# Altium footprint library mastermind.PCBLIB: 1061 footprints (part 56 of 67)
Each footprint in its own frame and in the unit in brackets; x right, y up, seen from the top. Pads: shape width x height; smd on the part's side, far side on the other; paste and mask are expansions set on the pad; w line width, h text height; cw(c..) or ccw(c..) is an arc to the next point about the centre after c.
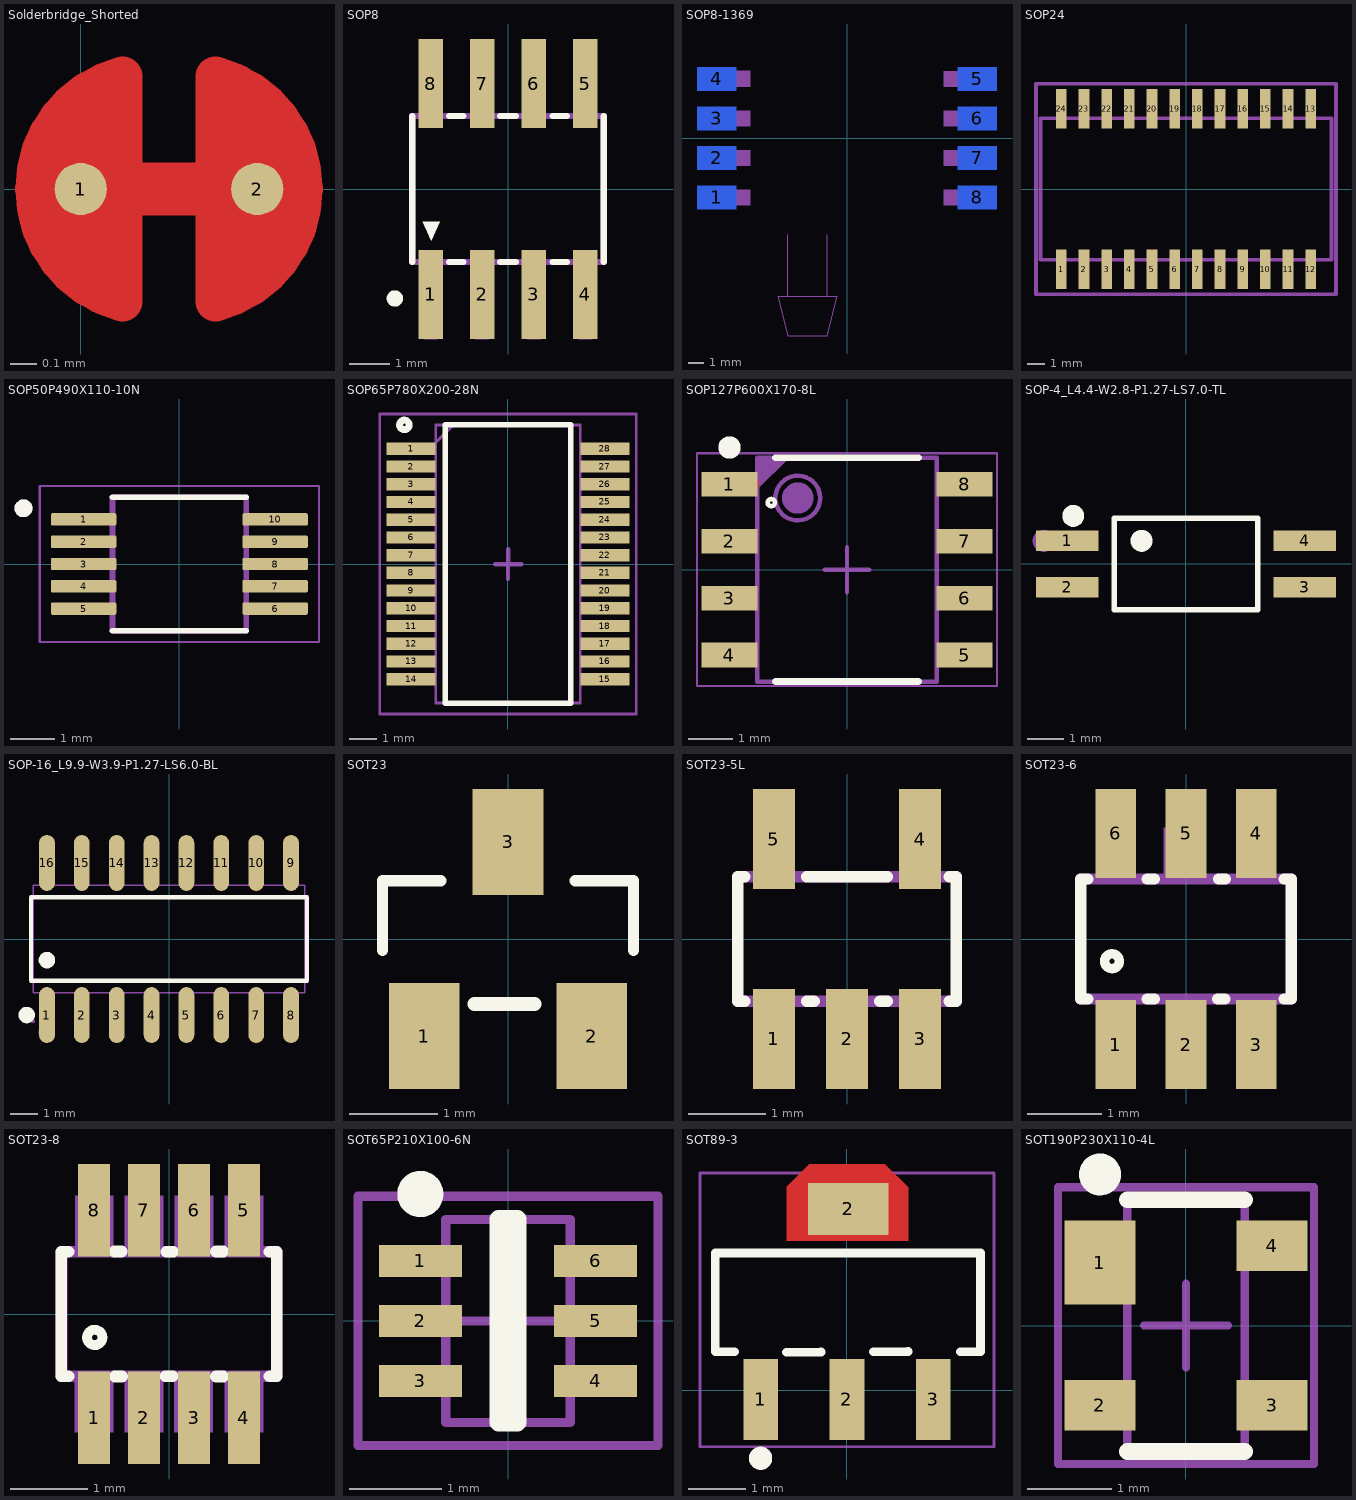
[diagram p55: the footprints below, top view; thin cyan lines are the x and y axes]

## Solderbridge_Shorted [mm]
pads (2):
  round 0.2 smd paste-10: 1(0,0) 2(0.676,0)
Top Layer:
  region: 0.236,-0.432 0.16,-0.505 0.042,-0.467 -0.023,-0.424 -0.097,-0.351 -0.15,-0.292 -0.208,-0.193 -0.236,-0.099 -0.231,0.122 -0.206,0.193 -0.122,0.33 -0.038,0.411 0.054,0.469 0.155,0.5 0.206,0.483 0.236,0.43
  region: 0.44,0.432 0.516,0.505 0.634,0.467 0.699,0.424 0.772,0.351 0.826,0.292 0.884,0.193 0.912,0.099 0.907,-0.122 0.881,-0.193 0.798,-0.33 0.714,-0.411 0.622,-0.469 0.521,-0.5 0.47,-0.483 0.44,-0.43
  lines w0.152: 0.159,-0.431 cw(c0.27,0) 0.159,0.431 ; 0.516,-0.431 ccw(c0.406,0) 0.516,0.431
  lines w0.203: 0,0 0.676,0
Top Solder:
  circle w0.61: c0.366,0 r0.279
  circle w0.61: c0.31,0 r0.279

## SOP8 [mm]
pads (8):
  rect 0.61x2.2 smd: 1(-1.905,-2.6) 2(-0.635,-2.6) 3(0.635,-2.6) 4(1.905,-2.6) 5(1.905,2.6) 6(0.635,2.6) 7(-0.635,2.6) 8(-1.905,2.6)
Top Overlay:
  circle w0.203: c-2.79,-2.7 r0.1
  region: -2.101,-0.802 -1.678,-0.802 -1.899,-1.278
  lines w0.152: -2.362,-1.803 -2.362,-0.497 -2.362,1.803 ; -1.45,-1.8 -1.1,-1.8 ; -1.45,1.8 -1.1,1.8 ; -0.2,-1.8 0.2,-1.8 ; -0.2,1.8 0.2,1.8 ; 1.1,-1.8 1.45,-1.8 ; 1.1,1.8 1.45,1.8 ; 2.362,-1.803 2.362,1.803
Mechanical 3:
  region: 1.727,1.854 1.727,3.7 2.083,3.7 2.083,1.854
  region: 0.457,1.854 0.457,3.7 0.813,3.7 0.813,1.854
  region: -0.813,1.854 -0.813,3.7 -0.457,3.7 -0.457,1.854
  region: -2.083,1.854 -2.083,3.7 -1.727,3.7 -1.727,1.854
  region: 1.727,-3.7 1.727,-1.854 2.083,-1.854 2.083,-3.7
  region: 0.457,-3.7 0.457,-1.854 0.813,-1.854 0.813,-3.7
  region: -0.813,-3.7 -0.813,-1.854 -0.457,-1.854 -0.457,-3.7
  region: -2.083,-3.7 -2.083,-1.854 -1.727,-1.854 -1.727,-3.7
  lines w0.152: -2.362,-1.803 -2.362,1.803 2.362,1.803 2.362,-1.803 -2.362,-1.803
3D body "User Library-sop8_model.STEP": height 1.55, standoff -0.01, extent -2.489,-2.966 2.411,3.013

## SOP8-1369 [mil]
pads (8):
  rect 100x60 smd far side: 1(-330,-150) 2(-330,-50) 3(-330,50) 4(-330,150) 5(330,150) 6(330,50) 7(330,-50) 8(330,-150)
Bottom Overlay:
  circle w0: c-187.5,-150 r23.58
  lines w8: -242.5,-230 ccw(c-230,-230) -230,-242.5 230,-242.5 ccw(c230,-230) 242.5,-230 ; -242.5,230 cw(c-230,230) -230,242.5 230,242.5 cw(c230,230) 242.5,230
Mechanical 13:
  region: -245,-130.16 -350.44,-130.16 -350.44,-170 -245,-170
  region: 350,-130.24 245.45,-130.24 245.45,-170 350,-170
  region: -245,-30.06 -350.66,-30.06 -350.66,-70 -245,-70
  region: -245,70.06 -350.3,70.06 -350.3,30 -245,30
  region: -245,170.23 -350.48,170.23 -350.48,130 -245,130
  region: 350,-30.06 245.48,-30.06 245.48,-70 350,-70
  region: 350,70.09 245.3,70.09 245.3,30 350,30
  region: 350,170.18 245.26,170.18 245.26,130 350,130
  lines w2: -150,-245 -150,-400 ; -50,-245 -50,-400 ; -150,-400 -175,-400 -150,-500 -50,-500 -25,-400 -50,-400 ; -150,-400 -50,-400
3D body "MPXV4006GP.STEP": height 340.06, standoff 0.5, extent -358.5,-492.5 358.5,232.5

## SOP24 [mm]
pads (24):
  rect 0.6x2.2 smd: 1(-6.985,-4.5) 2(-5.715,-4.5) 3(-4.445,-4.5) 4(-3.175,-4.5) 5(-1.905,-4.5) 6(-0.635,-4.5) 7(0.635,-4.5) 8(1.905,-4.5) 9(3.175,-4.5) 10(4.445,-4.5) 11(5.715,-4.5) 12(6.985,-4.5) 13(6.985,4.5) 14(5.715,4.5) 15(4.445,4.5) 16(3.175,4.5) 17(1.905,4.5) 18(0.635,4.5) 19(-0.635,4.5) 20(-1.905,4.5) 21(-3.175,4.5) 22(-4.445,4.5) 23(-5.715,4.5) 24(-6.985,4.5)
Mechanical 8:
  region: -7.235,-5.39 -7.235,-4.06 -6.735,-4.06 -6.735,-5.39
  region: -5.965,-5.39 -5.965,-4.06 -5.465,-4.06 -5.465,-5.39
  region: -4.695,-5.39 -4.695,-4.06 -4.195,-4.06 -4.195,-5.39
  region: -3.425,-5.39 -3.425,-4.06 -2.925,-4.06 -2.925,-5.39
  region: -2.155,-5.39 -2.155,-4.06 -1.655,-4.06 -1.655,-5.39
  region: -0.885,-5.39 -0.885,-4.06 -0.385,-4.06 -0.385,-5.39
  region: 0.385,-5.39 0.385,-4.06 0.885,-4.06 0.885,-5.39
  region: 1.655,-5.39 1.655,-4.06 2.155,-4.06 2.155,-5.39
  region: 2.925,-5.39 2.925,-4.06 3.425,-4.06 3.425,-5.39
  region: 4.195,-5.39 4.195,-4.06 4.695,-4.06 4.695,-5.39
  region: 5.465,-5.39 5.465,-4.06 5.965,-4.06 5.965,-5.39
  region: 6.735,-5.39 6.735,-4.06 7.235,-4.06 7.235,-5.39
  region: 6.735,4.06 6.735,5.39 7.235,5.39 7.235,4.06
  region: 5.465,4.06 5.465,5.39 5.965,5.39 5.965,4.06
  region: 4.195,4.06 4.195,5.39 4.695,5.39 4.695,4.06
  region: 2.925,4.06 2.925,5.39 3.425,5.39 3.425,4.06
  region: 1.655,4.06 1.655,5.39 2.155,5.39 2.155,4.06
  region: 0.385,4.06 0.385,5.39 0.885,5.39 0.885,4.06
  region: -0.885,4.06 -0.885,5.39 -0.385,5.39 -0.385,4.06
  region: -2.155,4.06 -2.155,5.39 -1.655,5.39 -1.655,4.06
  region: -3.425,4.06 -3.425,5.39 -2.925,5.39 -2.925,4.06
  region: -4.695,4.06 -4.695,5.39 -4.195,5.39 -4.195,4.06
  region: -5.965,4.06 -5.965,5.39 -5.465,5.39 -5.465,4.06
  region: -7.235,4.06 -7.235,5.39 -6.735,5.39 -6.735,4.06
  lines w0.203: -8.145,-3.96 8.145,-3.96 8.145,3.96 -8.145,3.96 -8.145,-3.96
Mechanical 29 (Mech34):
  lines w0.2: -8.4,-5.9 -8.4,5.9 8.4,5.9 8.4,-5.9 -8.4,-5.9

## SOP50P490X110-10N [mm]
pads (10):
  rrect25% 1.47x0.28 smd: 1(-2.15,1) 2(-2.15,0.5) 3(-2.15,0) 4(-2.15,-0.5) 5(-2.15,-1) 6(2.15,-1) 7(2.15,-0.5) 8(2.15,0) 9(2.15,0.5) 10(2.15,1)
Top Overlay:
  circle w0.2: c-3.5,1.25 r0.1
  lines w0.127: -1.5,-1.5 1.5,-1.5 ; -1.5,1.5 1.5,1.5
Mechanical 13:
  circle w0.2: c-3.5,1.25 r0.1
  lines w0.127: -1.5,-1.5 -1.5,1.5 1.5,1.5 1.5,-1.5 -1.5,-1.5
Mechanical 15:
  lines w0.05: -3.135,-1.75 -3.135,1.75 3.135,1.75 3.135,-1.75 -3.135,-1.75
3D body "ADS1115IDGST.STEP": height 0.96, standoff -0.14, extent -2.45,-1.5 2.45,1.5

## SOP65P780X200-28N [mm]
pads (28):
  rect 1.8x0.45 smd: 1(-3.55,4.225) 2(-3.55,3.575) 3(-3.55,2.925) 4(-3.55,2.275) 5(-3.55,1.625) 6(-3.55,0.975) 7(-3.55,0.325) 8(-3.55,-0.325) 9(-3.55,-0.975) 10(-3.55,-1.625) 11(-3.55,-2.275) 12(-3.55,-2.925) 13(-3.55,-3.575) 14(-3.55,-4.225) 15(3.55,-4.225) 16(3.55,-3.575) 17(3.55,-2.925) 18(3.55,-2.275) 19(3.55,-1.625) 20(3.55,-0.975) 21(3.55,-0.325) 22(3.55,0.325) 23(3.55,0.975) 24(3.55,1.625) 25(3.55,2.275) 26(3.55,2.925) 27(3.55,3.575) 28(3.55,4.225)
Top Overlay:
  circle w0.254: c-3.8,5.1 r0.175
  lines w0.2: -2.3,-5.1 -2.3,5.1 2.3,5.1 2.3,-5.1 -2.3,-5.1
Mechanical 13:
  lines w0.1: -2.65,4.45 -2,5.1 ; -2.65,-5.1 -2.65,5.1 2.65,5.1 2.65,-5.1 -2.65,-5.1
  lines w0.152: -0.47,-0.01 0.49,-0.01 ; 0,-0.55 0,0.53 0.01,0.54 0.01,-0.01
Mechanical 15:
  lines w0.1: -4.7,-5.5 -4.7,5.5 4.7,5.5 4.7,-5.5 -4.7,-5.5
3D body "GL850G-HH.stp": height -0.5, standoff -2.5, extent -3.77,-5.07 4.03,5.13

## SOP127P600X170-8L [mm] "SOP, 8-Leads, Body 4,90x3,90mm, Pitch 1,27mm, IPC High Density"
height 1.7
pads (8):
  rect 1.25x0.55 smd: 1(-2.625,1.905) 2(-2.625,0.635) 3(-2.625,-0.635) 4(-2.625,-1.905) 5(2.625,-1.905) 6(2.625,-0.635) 7(2.625,0.635) 8(2.625,1.905)
Top Layer:
  lines w0.3: -2.625,-1.905 -2.233,-1.905 ; -2.625,1.905 -2.111,1.905
Top Overlay:
  circle w0.25: c-2.625,2.73 r0.125
  circle w0.1: c-1.692,1.5 r0.08
  lines w0.152: -1.6,-2.5 1.6,-2.5 ; -1.6,2.5 1.6,2.5
Mechanical 13:
  circle w0.1: c-1.1,1.6 r0.5
  lines w0.1: -2,-2.5 -2,2.5 2,2.5 2,-2.5 -2,-2.5
Mechanical 15:
  lines w0.05: -3.35,-2.6 -3.35,2.6 3.35,2.6 3.35,-2.6 -3.35,-2.6
  lines w0.1: -0.5,0 0.5,0 ; 0,-0.5 0,0.5
Mechanical 29:
  circle w0.5: c-1.1,1.6 r0.1
  region: -1.294,2.5 -2,1.794 -2,2.5
  lines w0.1: -2,-2.5 2,-2.5 2,2.5 -2,2.5 -2,-2.5
  text ".Designator" at -0.677,0.508 h1.27
3D body: height 1, standoff 0, extent -1.078,1.106 -0.801,1.381
3D body "SOP127P600X170-8L.step": height 1.7, standoff 0, extent -3,-2.5 3,2.5

## SOP-4_L4.4-W2.8-P1.27-LS7.0-TL [mm]
pads (4):
  rect 1.71x0.56 smd paste+0 mask+0.051: 1(-3.255,0.635) 2(-3.255,-0.635) 3(3.255,-0.635) 4(3.255,0.635)
Top Overlay:
  circle w0.3: c-3.09,1.319 r0.15
  circle w0.3: c-1.219,0.635 r0.15
  lines w0.152: -1.971,-1.251 -1.971,1.251 1.971,1.251 1.971,-1.251 -1.971,-1.251
Mechanical 15:
  circle w0.3: c-3.9,0.635 r0.15
3D body "User Library-SSOP-4.STEP": height 2, standoff -0.02, extent -3.516,-1.354 3.484,1.346

## SOP-16_L9.9-W3.9-P1.27-LS6.0-BL [mm]
pads (16):
  oval 0.574x2.038 smd paste+0 mask+0.051: 1(-4.445,-2.769) 2(-3.175,-2.769) 3(-1.905,-2.769) 4(-0.635,-2.769) 5(0.635,-2.769) 6(1.905,-2.769) 7(3.175,-2.769) 8(4.445,-2.769) 9(4.445,2.769) 10(3.175,2.769) 11(1.905,2.769) 12(0.635,2.769) 13(-0.635,2.769) 14(-1.905,2.769) 15(-3.175,2.769) 16(-4.445,2.769)
Top Overlay:
  circle w0.3: c-4.445,-0.769 r0.15
  circle w0.3: c-5.184,-2.769 r0.15
  lines w0.152: -5.026,-1.521 5.026,-1.521 5.026,1.521 -5.026,1.521 -5.026,-1.521
Mechanical 6:
  circle w0.3: c-4.445,-3.4 r0.15
Mechanical 15:
  drawing of 37 lines, arcs and shapes, not listed
3D body "SO16 Narrow 3.9mm.step": height 1.35, standoff 0, extent -4.972,-2.974 4.928,3.005

## SOT23 [mm]
pads (3):
  rect 0.8x1.2 smd: 1(-0.95,-1.1) 2(0.95,-1.1) 3(0,1.1)
Top Overlay:
  lines w0.127: -1.422,-0.127 -1.422,0.66 -0.762,0.66 ; 0.762,0.66 1.422,0.66 1.422,-0.127
  lines w0.154: -0.381,-0.737 0.305,-0.737
Mechanical 8:
  region: -1.168,-1.295 -1.168,-0.711 -0.711,-0.711 -0.711,-1.295
  region: 0.711,-1.295 0.711,-0.711 1.168,-0.711 1.168,-1.295
  region: -0.229,0.711 -0.229,1.295 0.229,1.295 0.229,0.711
3D body "ALSRobot-SOT23.step": height 1.08, standoff 0, extent -1.5,-1.32 1.5,1.32

## SOT23-5L [mm]
pads (5):
  rect 0.55x1.3 smd: 1(-0.95,-1.3) 2(0,-1.3) 3(0.95,-1.3) 4(0.95,1.3) 5(-0.95,1.3)
Top Overlay:
  lines w0.152: -1.328,-0.81 -1.422,-0.81 -1.422,0.81 -1.328,0.81 ; -0.522,-0.81 -0.428,-0.81 ; -0.522,0.81 0.522,0.81 ; 0.428,-0.81 0.522,-0.81 ; 1.328,-0.81 1.422,-0.81 1.422,0.81 1.328,0.81
Mechanical 8:
  region: -1.2,-1.5 -1.2,-0.85 -0.7,-0.85 -0.7,-1.5
  region: -0.25,-1.5 -0.25,-0.85 0.25,-0.85 0.25,-1.5
  region: 0.7,-1.5 0.7,-0.85 1.2,-0.85 1.2,-1.5
  region: 0.7,0.85 0.7,1.5 1.2,1.5 1.2,0.85
  region: -1.2,0.85 -1.2,1.5 -0.7,1.5 -0.7,0.85
  lines w0.152: -1.422,-0.81 1.422,-0.81 ; -1.422,0.81 1.422,0.81
3D body "MIC5219-regulator.STEP": height 1.45, standoff 0, extent -1.45,-1.33 1.45,1.37

## SOT23-6 [mm]
pads (6):
  rect 0.55x1.2 smd: 1(-0.95,-1.427) 2(0,-1.427) 3(0.95,-1.427) 4(0.95,1.427) 5(0,1.427) 6(-0.95,1.427)
Top Overlay:
  circle w0.127: c-1,-0.3 r0.1
  lines w0.152: -1.328,-0.81 -1.422,-0.81 -1.422,0.81 -1.328,0.81 ; -0.522,-0.81 -0.428,-0.81 ; -0.522,0.81 -0.428,0.81 ; 0.428,-0.81 0.522,-0.81 ; 0.438,0.81 0.532,0.81 ; 1.328,-0.81 1.422,-0.81 1.422,0.81 1.328,0.81
Mechanical 8:
  region: -1.2,-1.5 -1.2,-0.85 -0.7,-0.85 -0.7,-1.5
  region: -0.25,-1.5 -0.25,-0.85 0.25,-0.85 0.25,-1.5
  region: 0.7,-1.5 0.7,-0.85 1.2,-0.85 1.2,-1.5
  region: 0.7,0.85 0.7,1.5 1.2,1.5 1.2,0.85
  region: -1.2,0.85 -1.2,1.5 -0.7,1.5 -0.7,0.85
  region: -0.3,0.85 -0.3,1.5 0.2,1.5 0.2,0.85
  lines w0.152: -1.422,-0.81 1.422,-0.81 ; -1.422,0.81 1.422,0.81
3D body "SOT23-6.stp": height 1.2, standoff 0.02, extent -1.49,-1.408 1.51,1.428

## SOT23-8 [mm]
pads (8):
  rect 0.42x1.2 smd: 1(-0.975,-1.35) 2(-0.325,-1.35) 3(0.325,-1.35) 4(0.975,-1.35) 5(0.975,1.35) 6(0.325,1.35) 7(-0.325,1.35) 8(-0.975,1.35)
Top Overlay:
  circle w0.127: c-0.965,-0.305 r0.1
  lines w0.152: -1.306,-0.81 -1.4,-0.81 -1.4,0.81 -1.306,0.81 ; -0.711,0.813 -0.617,0.813 ; -0.704,-0.813 -0.61,-0.813 ; -0.047,-0.81 0.047,-0.81 ; -0.037,0.81 0.057,0.81 ; 0.61,-0.813 0.704,-0.813 ; 0.61,0.813 0.704,0.813 ; 1.306,-0.81 1.4,-0.81 1.4,0.81 1.306,0.81
Mechanical 8:
  region: -1.224,-1.537 -1.224,-0.886 -0.724,-0.886 -0.724,-1.537
  region: -0.575,-1.539 -0.575,-0.889 -0.075,-0.889 -0.075,-1.539
  region: 0.07,-1.539 0.07,-0.889 0.57,-0.889 0.57,-1.539
  region: 0.723,-1.539 0.723,-0.889 1.223,-0.889 1.223,-1.539
  region: 0.725,0.886 0.725,1.537 1.225,1.537 1.225,0.886
  region: 0.073,0.886 0.073,1.537 0.573,1.537 0.573,0.886
  region: -0.573,0.886 -0.573,1.537 -0.073,1.537 -0.073,0.886
  region: -1.222,0.889 -1.222,1.539 -0.722,1.539 -0.722,0.889
  lines w0.152: -1.397,-0.81 1.4,-0.81 1.4,0.81 -1.397,0.81 -1.397,-0.81

## SOT65P210X100-6N [mm]
pads (6):
  rect 0.9x0.35 smd: 1(-0.95,0.65) 2(-0.95,0) 3(-0.95,-0.65) 4(0.95,-0.65) 5(0.95,0) 6(0.95,0.65)
Top Overlay:
  circle w0.25: c-0.95,1.375 r0.125
  lines w0.2: -0.1,-1.1 -0.1,1.1 0.1,1.1 0.1,-1.1 -0.1,-1.1
Mechanical 13:
  lines w0.1: -0.675,-1.1 0.675,-1.1 0.675,1.1 -0.675,1.1 -0.675,-1.1
Mechanical 15:
  lines w0.1: -0.5,0 0.5,0 ; 0,-0.5 0,0.5 ; -1.625,-1.35 1.625,-1.35 1.625,1.35 -1.625,1.35 -1.625,-1.35
3D body "SW3dPS-SC70-6.STEP": height 0.92, standoff -0.03, extent -1.05,-1 1.05,1

## SOT89-3 [mm]
pads (4):
  rect 0.6x1.4 smd: 1(-1.5,-0.16) 2(0,-0.16) 3(1.5,-0.16)
  rect 1.4x0.9 smd: 2(0.019,3.148)
Top Layer:
  region: -0.653,3.926 0.656,3.926 1.06,3.523 1.06,2.591 -1.049,2.592 -1.049,3.529
Top Overlay:
  circle w0.2: c-1.5,-1.18 r0.1
  lines w0.152: -1.951,0.67 -2.285,0.67 -2.285,2.38 2.315,2.38 2.315,0.67 1.964,0.67 ; -1.049,0.661 -0.449,0.662 ; 0.46,0.67 1.06,0.672
Top Solder:
  region: -0.653,3.926 0.656,3.926 1.06,3.523 1.06,2.591 -1.049,2.592 -1.049,3.529
Mechanical 13:
  circle w0.2: c-1.5,-1.18 r0.1
Mechanical 15:
  lines w0.05: -2.55,-0.98 -2.55,3.77 2.55,3.77 2.55,-0.98 -2.55,-0.98
3D body "SOT-89.step": height 1.35, standoff 0, extent -2.31,-0.68 2.29,3.57

## SOT190P230X110-4L [mm]
pads (4):
  rect 0.85x1 smd: 1(-1.025,0.75)
  rect 0.85x0.6 smd: 2(-1.025,-0.95) 3(1.025,-0.95) 4(1.025,0.95)
Top Overlay:
  circle w0.25: c-1.025,1.8 r0.125
  lines w0.2: -0.7,-1.5 0.7,-1.5 ; -0.7,1.5 0.7,1.5
Mechanical 13:
  lines w0.1: -0.7,-1.5 0.7,-1.5 0.7,1.5 -0.7,1.5 -0.7,-1.5
Mechanical 15:
  lines w0.1: -0.5,0 0.5,0 ; 0,-0.5 0,0.5 ; -1.525,-1.65 1.525,-1.65 1.525,1.65 -1.525,1.65 -1.525,-1.65
3D body "User Library-sot143.step": height 1, standoff 0, extent -1.21,-1.46 1.21,1.46